# Altium footprint library PCB1.PcbLib: 98 footprints (part 5 of 7)
Each footprint in its own frame and in the unit in brackets; x right, y up, seen from the top. Pads: shape width x height; smd on the part's side, far side on the other; paste and mask are expansions set on the pad; w line width, h text height; cw(c..) or ccw(c..) is an arc to the next point about the centre after c.
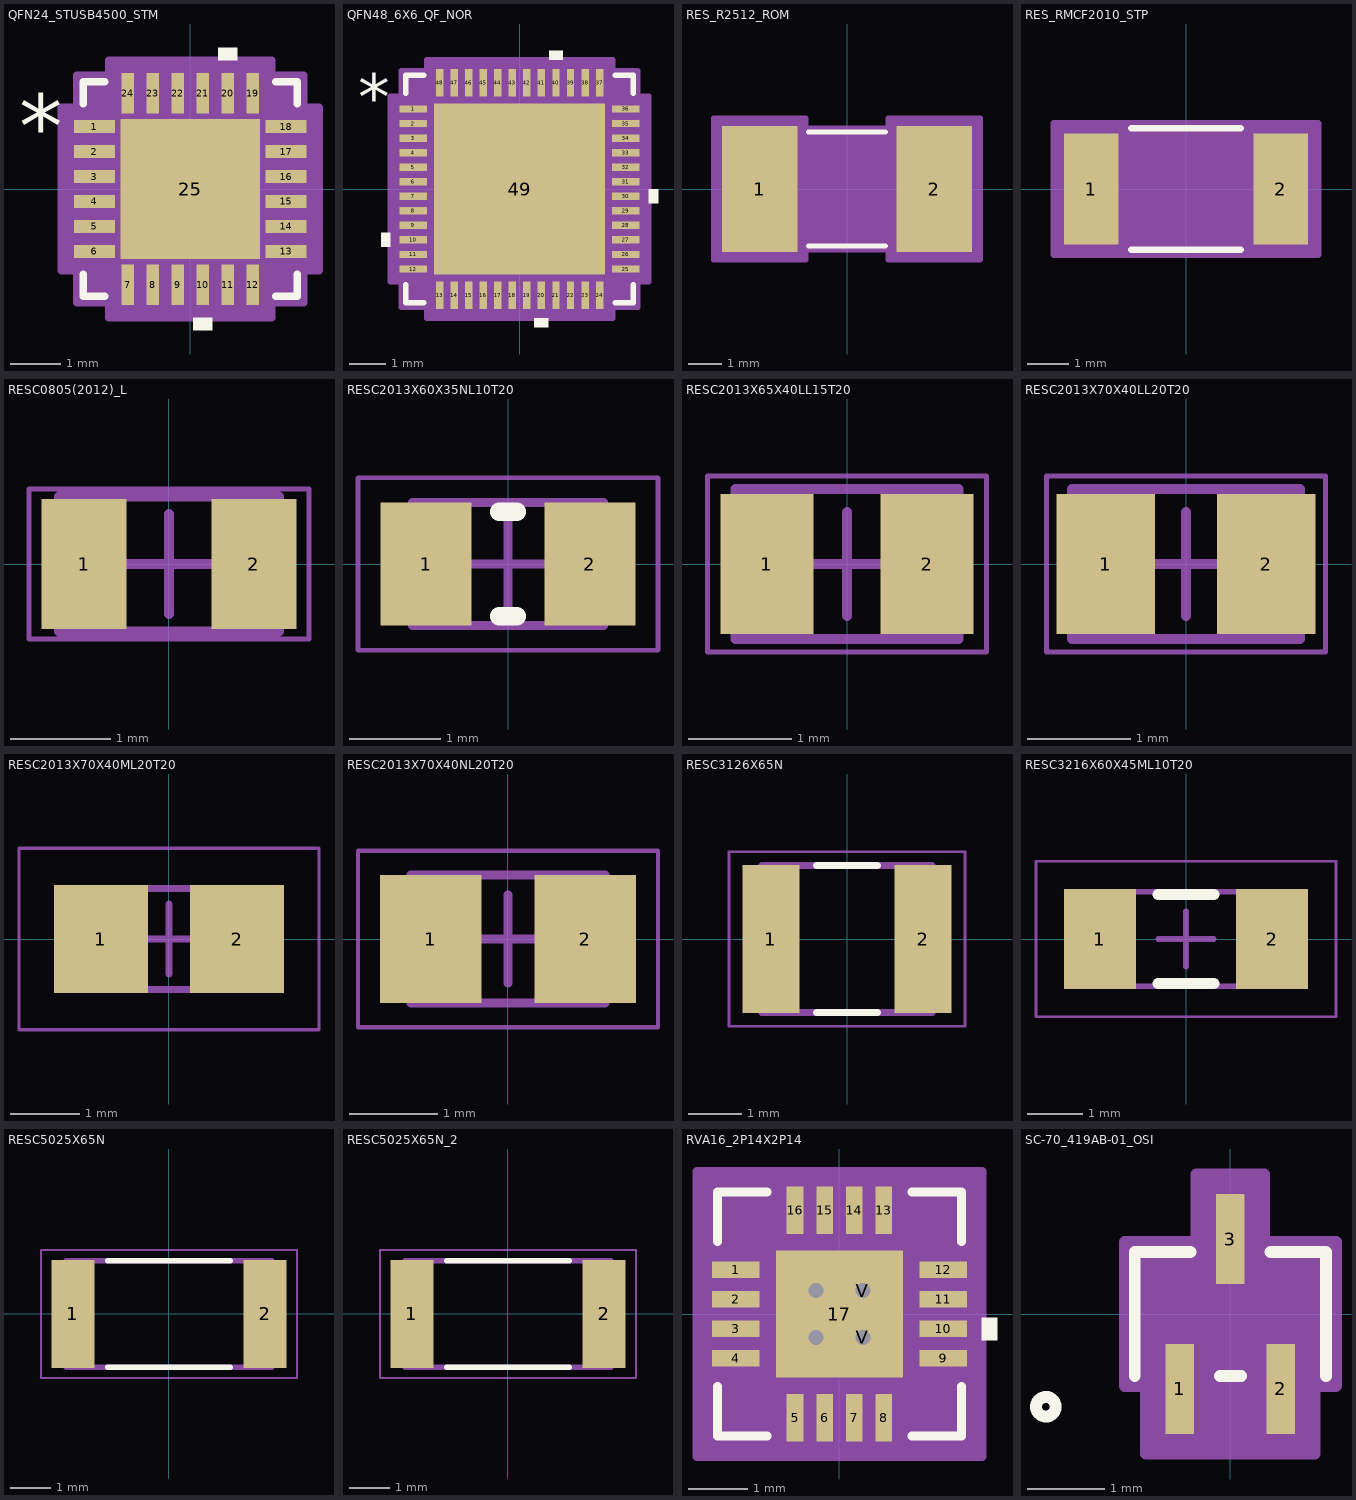
[diagram p4: the footprints below, top view; thin cyan lines are the x and y axes]

## QFN24_STUSB4500_STM [mil]
pads (25):
  rect 32x10 smd paste+0 mask+0: 1(-75.5,49.23) 2(-75.5,29.54) 3(-75.5,9.85) 4(-75.5,-9.85) 5(-75.5,-29.54) 6(-75.5,-49.23) 13(75.5,-49.23) 14(75.5,-29.54) 15(75.5,-9.85) 16(75.5,9.85) 17(75.5,29.54) 18(75.5,49.23)
  rect 10x32 smd paste+0 mask+0: 7(-49.23,-75.5) 8(-29.54,-75.5) 9(-9.85,-75.5) 10(9.85,-75.5) 11(29.54,-75.5) 12(49.23,-75.5) 19(49.23,75.5) 20(29.54,75.5) 21(9.85,75.5) 22(-9.85,75.5) 23(-29.54,75.5) 24(-49.23,75.5)
  rect 110x110 smd paste+0 mask+0: 25(0,0)
Top Overlay:
  region: 37.03,101.5 22.04,101.5 22.04,111.5 37.03,111.5
  region: 17.34,-101.5 2.35,-101.5 2.35,-111.5 17.34,-111.5
  lines w6: -84.5,-67.33 -84.5,-84.5 -67.33,-84.5 ; -84.5,67.33 -84.5,84.5 -67.33,84.5 ; 67.33,-84.5 84.5,-84.5 84.5,-67.33 ; 67.33,84.5 84.5,84.5 84.5,67.33
  text "*" at -135,25 h50
Top 3D Body:
  lines w1: -79.5,29.5 -29.5,79.5 ; -79.5,-79.5 -79.5,79.5 79.5,79.5 79.5,-79.5 -79.5,-79.5 ; -79.5,-55.23 -79.5,-43.23 -79.5,-55.23 ; -79.5,-35.53 -79.5,-23.54 -79.5,-35.53 ; -79.5,-15.85 -79.5,-3.85 -79.5,-15.85 ; -79.5,3.85 -79.5,15.85 -79.5,3.85 ; -79.5,23.54 -79.5,35.53 -79.5,23.54 ; -79.5,43.23 -79.5,55.23 -79.5,43.23 ; -55.23,-79.5 -43.23,-79.5 -55.23,-79.5 ; -55.23,79.5 -43.23,79.5 -55.23,79.5 ; -35.53,-79.5 -23.54,-79.5 -35.53,-79.5 ; -35.53,79.5 -23.54,79.5 -35.53,79.5 ; -15.85,-79.5 -3.85,-79.5 -15.85,-79.5 ; -15.85,79.5 -3.85,79.5 -15.85,79.5 ; 3.85,-79.5 15.85,-79.5 3.85,-79.5 ; 3.85,79.5 15.85,79.5 3.85,79.5 ; 23.54,-79.5 35.53,-79.5 23.54,-79.5 ; 23.54,79.5 35.53,79.5 23.54,79.5 ; 43.23,-79.5 55.23,-79.5 43.23,-79.5 ; 43.23,79.5 55.23,79.5 43.23,79.5 ; 79.5,-55.23 79.5,-43.23 79.5,-55.23 ; 79.5,-35.53 79.5,-23.54 79.5,-35.53 ; 79.5,-15.85 79.5,-3.85 79.5,-15.85 ; 79.5,3.85 79.5,15.85 79.5,3.85 ; 79.5,23.54 79.5,35.53 79.5,23.54 ; 79.5,43.23 79.5,55.23 79.5,43.23
Top Courtyard:
  region: -64.22,-89.5 -89.5,-89.5 -89.5,-64.22 -101.5,-64.22 -101.5,64.22 -89.5,64.22 -89.5,89.5 -64.22,89.5 -64.22,101.5 64.22,101.5 64.22,89.5 89.5,89.5 89.5,64.22 101.5,64.22 101.5,-64.22 89.5,-64.22 89.5,-89.5 64.22,-89.5 64.22,-101.5 -64.22,-101.5
  lines w6: -101.5,-64.22 -101.5,64.22 -89.5,64.22 -89.5,89.5 -64.22,89.5 -64.22,101.5 64.22,101.5 64.22,89.5 89.5,89.5 89.5,64.22 101.5,64.22 101.5,-64.22 89.5,-64.22 89.5,-89.5 64.22,-89.5 64.22,-101.5 -64.22,-101.5 -64.22,-89.5 -89.5,-89.5 -89.5,-64.22 -101.5,-64.22
3D body "QFN24_STUSB4500_STM.step": height 39.09, standoff 0, extent -79.49,-79.49 79.49,79.49

## QFN48_6X6_QF_NOR [mm]
pads (49):
  rect 0.757x0.204 smd paste+0 mask+0: 1(-2.919,2.2) 2(-2.919,1.8) 3(-2.919,1.4) 4(-2.919,1) 5(-2.919,0.6) 6(-2.919,0.2) 7(-2.919,-0.2) 8(-2.919,-0.6) 9(-2.919,-1) 10(-2.919,-1.4) 11(-2.919,-1.8) 12(-2.919,-2.2) 25(2.919,-2.2) 26(2.919,-1.8) 27(2.919,-1.4) 28(2.919,-1) 29(2.919,-0.6) 30(2.919,-0.2) 31(2.919,0.2) 32(2.919,0.6) 33(2.919,1) 34(2.919,1.4) 35(2.919,1.8) 36(2.919,2.2)
  rect 0.204x0.757 smd paste+0 mask+0: 13(-2.2,-2.919) 14(-1.8,-2.919) 15(-1.4,-2.919) 16(-1,-2.919) 17(-0.6,-2.919) 18(-0.2,-2.919) 19(0.2,-2.919) 20(0.6,-2.919) 21(1,-2.919) 22(1.4,-2.919) 23(1.8,-2.919) 24(2.2,-2.919) 37(2.2,2.919) 38(1.8,2.919) 39(1.4,2.919) 40(1,2.919) 41(0.6,2.919) 42(0.2,2.919) 43(-0.2,2.919) 44(-0.6,2.919) 45(-1,2.919) 46(-1.4,2.919) 47(-1.8,2.919) 48(-2.2,2.919)
  rect 4.699x4.699 smd paste-2.349 mask+0: 49(0,0)
Top Overlay:
  region: -3.551,-1.209 -3.805,-1.209 -3.805,-1.59 -3.551,-1.59
  region: 0.79,-3.551 0.409,-3.551 0.409,-3.805 0.79,-3.805
  region: 3.551,-0.009 3.805,-0.009 3.805,-0.39 3.551,-0.39
  region: 1.191,3.551 0.81,3.551 0.81,3.805 1.191,3.805
  lines w0.152: -3.124,-2.635 -3.124,-3.124 -2.635,-3.124 ; -3.124,2.635 -3.124,3.124 -2.635,3.124 ; 2.635,-3.124 3.124,-3.124 3.124,-2.635 ; 2.635,3.124 3.124,3.124 3.124,2.635
  text "*" at -4.443,1.889 h1.27
Top Paste:
  region: -0.883,2.25 -2.25,2.25 -2.25,0.883 -0.883,0.883
  region: -0.883,0.683 -2.25,0.683 -2.25,-0.683 -0.883,-0.683
  region: -0.883,-0.883 -2.25,-0.883 -2.25,-2.25 -0.883,-2.25
  region: 0.683,2.25 -0.683,2.25 -0.683,0.883 0.683,0.883
  region: 0.683,0.683 -0.683,0.683 -0.683,-0.683 0.683,-0.683
  region: 0.683,-0.883 -0.683,-0.883 -0.683,-2.25 0.683,-2.25
  region: 2.25,2.25 0.883,2.25 0.883,0.883 2.25,0.883
  region: 2.25,0.683 0.883,0.683 0.883,-0.683 2.25,-0.683
  region: 2.25,-0.883 0.883,-0.883 0.883,-2.25 2.25,-2.25
Top 3D Body:
  lines w0.025: -2.997,1.727 -1.727,2.997 ; -2.997,-2.997 2.997,-2.997 2.997,2.997 -2.997,2.997 -2.997,-2.997 ; -2.997,-2.327 -2.997,-2.073 -2.997,-2.327 ; -2.997,-1.927 -2.997,-1.673 -2.997,-1.927 ; -2.997,-1.527 -2.997,-1.273 -2.997,-1.527 ; -2.997,-1.127 -2.997,-0.873 -2.997,-1.127 ; -2.997,-0.727 -2.997,-0.473 -2.997,-0.727 ; -2.997,-0.327 -2.997,-0.073 -2.997,-0.327 ; -2.997,0.073 -2.997,0.327 -2.997,0.073 ; -2.997,0.473 -2.997,0.727 -2.997,0.473 ; -2.997,0.873 -2.997,1.127 -2.997,0.873 ; -2.997,1.273 -2.997,1.527 -2.997,1.273 ; -2.997,1.673 -2.997,1.927 -2.997,1.673 ; -2.997,2.073 -2.997,2.327 -2.997,2.073 ; -2.327,-2.997 -2.073,-2.997 -2.327,-2.997 ; -2.327,2.997 -2.073,2.997 -2.327,2.997 ; -1.927,-2.997 -1.673,-2.997 -1.927,-2.997 ; -1.927,2.997 -1.673,2.997 -1.927,2.997 ; -1.527,-2.997 -1.273,-2.997 -1.527,-2.997 ; -1.527,2.997 -1.273,2.997 -1.527,2.997 ; -1.127,-2.997 -0.873,-2.997 -1.127,-2.997 ; -1.127,2.997 -0.873,2.997 -1.127,2.997 ; -0.727,-2.997 -0.473,-2.997 -0.727,-2.997 ; -0.727,2.997 -0.473,2.997 -0.727,2.997 ; -0.327,-2.997 -0.073,-2.997 -0.327,-2.997 ; -0.327,2.997 -0.073,2.997 -0.327,2.997 ; 0.073,-2.997 0.327,-2.997 0.073,-2.997 ; 0.073,2.997 0.327,2.997 0.073,2.997 ; 0.473,-2.997 0.727,-2.997 0.473,-2.997 ; 0.473,2.997 0.727,2.997 0.473,2.997 ; 0.873,-2.997 1.127,-2.997 0.873,-2.997 ; 0.873,2.997 1.127,2.997 0.873,2.997 ; 1.273,-2.997 1.527,-2.997 1.273,-2.997 ; 1.273,2.997 1.527,2.997 1.273,2.997 ; 1.673,-2.997 1.927,-2.997 1.673,-2.997 ; 1.673,2.997 1.927,2.997 1.673,2.997 ; 2.073,-2.997 2.327,-2.997 2.073,-2.997 ; 2.073,2.997 2.327,2.997 2.073,2.997 ; 2.997,-2.327 2.997,-2.073 2.997,-2.327 ; 2.997,-1.927 2.997,-1.673 2.997,-1.927 ; 2.997,-1.527 2.997,-1.273 2.997,-1.527 ; 2.997,-1.127 2.997,-0.873 2.997,-1.127 ; 2.997,-0.727 2.997,-0.473 2.997,-0.727 ; 2.997,-0.327 2.997,-0.073 2.997,-0.327 ; 2.997,0.073 2.997,0.327 2.997,0.073 ; 2.997,0.473 2.997,0.727 2.997,0.473 ; 2.997,0.873 2.997,1.127 2.997,0.873 ; 2.997,1.273 2.997,1.527 2.997,1.273 ; 2.997,1.673 2.997,1.927 2.997,1.673 ; 2.997,2.073 2.997,2.327 2.997,2.073
Top Courtyard:
  region: -2.556,-3.251 -3.251,-3.251 -3.251,-2.556 -3.551,-2.556 -3.551,2.556 -3.251,2.556 -3.251,3.251 -2.556,3.251 -2.556,3.551 2.556,3.551 2.556,3.251 3.251,3.251 3.251,2.556 3.551,2.556 3.551,-2.556 3.251,-2.556 3.251,-3.251 2.556,-3.251 2.556,-3.551 -2.556,-3.551
  lines w0.152: -3.551,-2.556 -3.251,-2.556 -3.251,-3.251 -2.556,-3.251 -2.556,-3.551 2.556,-3.551 2.556,-3.251 3.251,-3.251 3.251,-2.556 3.551,-2.556 3.551,2.556 3.251,2.556 3.251,3.251 2.556,3.251 2.556,3.551 -2.556,3.551 -2.556,3.251 -3.251,3.251 -3.251,2.556 -3.551,2.556 -3.551,-2.556
3D body "QFN48_6X6_QF_NOR.step": height 0.89, standoff 0, extent -2.997,-2.997 2.997,2.997

## RES_R2512_ROM [mil]
pads (2):
  rect 90.5x150 smd paste+0 mask+0: 1(-104.25,0) 2(104.25,0)
Top Overlay:
  lines w6: -45.9,-68 45.9,-68 ; -45.9,68 45.9,68
Top 3D Body:
  lines w1: -126,-63 -126,63 126,63 126,-63 -126,-63
Top Courtyard:
  region: -49,73 49,73 49,-85 159.5,-85 159.5,85 49,85 49,-85 49,-73 -49,-73 -49,85 -159.5,85 -159.5,-85 -49,-85 -49,85
  lines w6: -49,85 -49,73 49,73 49,-85 ; -49,85 -49,-85 -159.5,-85 -159.5,85 -49,85 ; -49,85 -49,-73 49,-73 49,-85 ; 49,-85 49,85 159.5,85 159.5,-85 49,-85
3D body "Resistor_2512.step": height 25.98, standoff 0.39, extent -117.53,-60.88 130.5,65.1

## RES_RMCF2010_STP [mil]
pads (2):
  rect 52x106 smd paste+0 mask+0: 1(-90.5,0) 2(90.5,0)
Top Overlay:
  lines w6: -52.39,-58 52.39,-58 ; -52.39,58 52.39,58
Top 3D Body:
  lines w1: -102.5,-53 -102.5,53 ; -102.5,-53 -64.5,-53 -64.5,53 -102.5,53 ; -102.5,-53 102.5,-53 ; -102.5,-53 -102.5,53 ; -102.5,53 102.5,53 ; 102.5,-53 64.5,-53 64.5,53 102.5,53 ; 102.5,-53 102.5,53 ; 102.5,-53 102.5,53
Top Courtyard:
  region: 126.5,-63 -126.5,-63 -126.5,63 126.5,63
  lines w6: -126.5,-63 -126.5,63 126.5,63 126.5,-63 -126.5,-63
3D body "RES_RMCF2010_STP.step": height 27.99, standoff 0, extent -102.52,-52.99 102.52,52.99

## RESC0805(2012)_L [mm]
pads (2):
  rect 0.85x1.3 smd: 1(-0.85,0) 2(0.85,0)
Top 3D Body:
  lines w0.1: -1.1,-0.675 1.1,-0.675 1.1,0.675 -1.1,0.675 -1.1,-0.675
Top Courtyard:
  lines w0.05: -1.4,-0.75 1.4,-0.75 1.4,0.75 -1.4,0.75 -1.4,-0.75
  lines w0.1: -0.5,0 0.5,0 ; 0,-0.5 0,0.5
3D body: height 0.7, standoff 0, extent 0.68,-0.675 1.1,0.675
3D body: height 0.7, standoff 0, extent -0.68,-0.675 0.68,0.675
3D body: height 0.7, standoff 0, extent -1.1,-0.675 -0.68,0.675

## RESC2013X60X35NL10T20 [mm]
pads (2):
  rect 1x1.35 smd: 1(-0.9,0) 2(0.9,0)
Top Overlay:
  lines w0.2: -0.1,-0.575 0.1,-0.575 ; -0.1,0.575 0.1,0.575
Top 3D Body:
  lines w0.1: -1.05,-0.675 1.05,-0.675 1.05,0.675 -1.05,0.675 -1.05,-0.675
Top Courtyard:
  lines w0.05: -1.65,-0.95 1.65,-0.95 1.65,0.95 -1.65,0.95 -1.65,-0.95
  lines w0.1: -0.5,0 0.5,0 ; 0,-0.5 0,0.5
3D body: height 0.6, standoff 0, extent 0.7,-0.675 1.05,0.675
3D body: height 0.6, standoff 0, extent -1.05,-0.675 -0.7,0.675
3D body: height 0.6, standoff 0, extent -0.7,-0.675 0.7,0.675

## RESC2013X65X40LL15T20 [mm]
pads (2):
  rect 0.9x1.35 smd: 1(-0.775,0) 2(0.775,0)
Top 3D Body:
  lines w0.1: -1.075,-0.725 1.075,-0.725 1.075,0.725 -1.075,0.725 -1.075,-0.725
Top Courtyard:
  lines w0.05: -1.35,-0.85 1.35,-0.85 1.35,0.85 -1.35,0.85 -1.35,-0.85
  lines w0.1: -0.5,0 0.5,0 ; 0,-0.5 0,0.5
3D body: height 0.65, standoff 0, extent 0.675,-0.725 1.075,0.725
3D body: height 0.65, standoff 0, extent -1.075,-0.725 -0.675,0.725
3D body: height 0.65, standoff 0, extent -0.675,-0.725 0.675,0.725

## RESC2013X70X40LL20T20 [mm]
pads (2):
  rect 0.95x1.35 smd: 1(-0.775,0) 2(0.775,0)
Top 3D Body:
  lines w0.1: -1.1,-0.725 1.1,-0.725 1.1,0.725 -1.1,0.725 -1.1,-0.725
Top Courtyard:
  lines w0.05: -1.35,-0.85 1.35,-0.85 1.35,0.85 -1.35,0.85 -1.35,-0.85
  lines w0.1: -0.5,0 0.5,0 ; 0,-0.5 0,0.5
3D body: height 0.7, standoff 0, extent 0.7,-0.725 1.1,0.725
3D body: height 0.7, standoff 0, extent -1.1,-0.725 -0.7,0.725
3D body: height 0.7, standoff 0, extent -0.7,-0.725 0.7,0.725

## RESC2013X70X40ML20T20 [mm]
pads (2):
  rect 1.35x1.55 smd: 1(-0.975,0) 2(0.975,0)
Top 3D Body:
  lines w0.1: -1.1,-0.725 -1.1,0.725 1.1,0.725 1.1,-0.725 -1.1,-0.725
Top Courtyard:
  lines w0.05: -2.15,-1.3 -2.15,1.3 2.15,1.3 2.15,-1.3 -2.15,-1.3
  lines w0.1: -0.5,0 0.5,0 ; 0,-0.5 0,0.5
3D body: height 0.7, standoff 0, extent -0.7,-0.725 0.7,0.725
3D body: height 0.7, standoff 0, extent -1.1,-0.725 -0.7,0.725
3D body: height 0.7, standoff 0, extent 0.7,-0.725 1.1,0.725

## RESC2013X70X40NL20T20 [mm]
pads (2):
  rect 1.15x1.45 smd: 1(-0.875,0) 2(0.875,0)
Top 3D Body:
  lines w0.1: -1.1,-0.725 -1.1,0.725 1.1,0.725 1.1,-0.725 -1.1,-0.725
Top Courtyard:
  lines w0.05: -1.7,-1 -1.7,1 1.7,1 1.7,-1 -1.7,-1
  lines w0.1: -0.5,0 0.5,0 ; 0,-0.5 0,0.5
3D body: height 0.7, standoff 0, extent -0.7,-0.725 0.7,0.725
3D body: height 0.7, standoff 0, extent -1.1,-0.725 -0.7,0.725
3D body: height 0.7, standoff 0, extent 0.7,-0.725 1.1,0.725

## RESC3126X65N [mm]
pads (2):
  rect 1.07x2.77 smd: 1(-1.43,0) 2(1.43,0)
Top Overlay:
  lines w0.127: -0.57,-1.38 0.57,-1.38 ; -0.57,1.38 0.57,1.38
Top 3D Body:
  lines w0.127: -1.6,-1.38 1.6,-1.38 1.6,1.38 -1.6,1.38 -1.6,-1.38
Top Courtyard:
  lines w0.05: -2.215,-1.635 2.215,-1.635 2.215,1.635 -2.215,1.635 -2.215,-1.635
3D body "step_temp.STEP": height 0.65, standoff 0, extent -1.55,-1.3 1.55,1.3

## RESC3216X60X45ML10T20 [mm]
pads (2):
  rect 1.3x1.8 smd: 1(-1.55,0) 2(1.55,0)
Top Overlay:
  lines w0.2: -0.5,-0.8 0.5,-0.8 ; -0.5,0.8 0.5,0.8
Top 3D Body:
  lines w0.1: -1.65,-0.85 1.65,-0.85 1.65,0.85 -1.65,0.85 -1.65,-0.85
Top Courtyard:
  lines w0.05: -2.7,-1.4 2.7,-1.4 2.7,1.4 -2.7,1.4 -2.7,-1.4
  lines w0.1: -0.5,0 0.5,0 ; 0,-0.5 0,0.5
3D body: height 0.6, standoff 0, extent 1.2,-0.85 1.65,0.85
3D body: height 0.6, standoff 0, extent -1.65,-0.85 -1.2,0.85
3D body: height 0.6, standoff 0, extent -1.2,-0.85 1.2,0.85

## RESC5025X65N [mm]
pads (2):
  rect 1.07x2.67 smd: 1(-2.38,0) 2(2.38,0)
Top Overlay:
  lines w0.127: -1.52,-1.32 1.52,-1.32 ; -1.52,1.32 1.52,1.32
Top 3D Body:
  lines w0.127: -2.55,-1.32 -2.55,1.32 2.55,1.32 2.55,-1.32 -2.55,-1.32
Top Courtyard:
  lines w0.05: -3.165,-1.585 -3.165,1.585 3.165,1.585 3.165,-1.585 -3.165,-1.585
3D body "RC2010JK-079K1L.step": height 0.65, standoff 0, extent -2.373,-1.25 2.627,1.25

## RESC5025X65N_2 [mm]
pads (2):
  rect 1.07x2.67 smd: 1(-2.38,0) 2(2.38,0)
Top Overlay:
  lines w0.127: -1.52,-1.32 1.52,-1.32 ; -1.52,1.32 1.52,1.32
Top 3D Body:
  lines w0.127: -2.55,-1.32 -2.55,1.32 2.55,1.32 2.55,-1.32 -2.55,-1.32
Top Courtyard:
  lines w0.05: -3.165,-1.585 -3.165,1.585 3.165,1.585 3.165,-1.585 -3.165,-1.585
3D body "RC2010JK-079K1L.step": height 0.65, standoff 0, extent -2.373,-1.25 2.627,1.25

## RVA16_2P14X2P14 [mm]
pads (21):
  rect 0.8x0.28 smd paste-0.14 mask-0.394: 1(-1.75,0.75) 2(-1.75,0.25) 3(-1.75,-0.25) 4(-1.75,-0.75) 9(1.75,-0.75) 10(1.75,-0.25) 11(1.75,0.25) 12(1.75,0.75)
  rect 0.28x0.8 smd paste-0.14 mask-0.394: 5(-0.75,-1.75) 6(-0.25,-1.75) 7(0.25,-1.75) 8(0.75,-1.75) 13(0.75,1.75) 14(0.25,1.75) 15(-0.25,1.75) 16(-0.75,1.75)
  rect 2.14x2.14 smd paste-1.057 mask-1.054: 17(0,0)
  round 0.508 hole 0.254 paste-2539.97 mask-0.254: V(0.394,-0.394) V(0.394,0.394) ""(-0.394,-0.394) ""(-0.394,0.394)
Top Overlay:
  region: 2.404,-0.059 2.658,-0.059 2.658,-0.44 2.404,-0.44
  lines w0.152: -2.057,-1.223 -2.057,-2.057 -1.223,-2.057 ; -2.057,1.223 -2.057,2.057 -1.223,2.057 ; 1.223,-2.057 2.057,-2.057 2.057,-1.223 ; 1.223,2.057 2.057,2.057 2.057,1.223
Top Paste:
  region: 0.995,-0.494 0.635,-0.494 0.494,-0.635 0.494,-0.995 0.995,-0.995
  region: 0.995,0.294 0.635,0.294 0.494,0.152 0.494,-0.152 0.635,-0.294 0.995,-0.294
  region: 0.995,0.995 0.494,0.995 0.494,0.635 0.635,0.494 0.995,0.494
  region: 0.152,-0.494 -0.152,-0.494 -0.294,-0.635 -0.294,-0.995 0.294,-0.995 0.294,-0.635
  region: 0.152,0.294 -0.152,0.294 -0.294,0.152 -0.294,-0.152 -0.152,-0.294 0.152,-0.294 0.294,-0.152 0.294,0.152
  region: 0.294,0.995 -0.294,0.995 -0.294,0.635 -0.152,0.494 0.152,0.494 0.294,0.635
  region: -0.635,-0.494 -0.995,-0.494 -0.995,-0.995 -0.494,-0.995 -0.494,-0.635
  region: -0.635,0.294 -0.995,0.294 -0.995,-0.294 -0.635,-0.294 -0.494,-0.152 -0.494,0.152
  region: -0.494,0.995 -0.995,0.995 -0.995,0.494 -0.635,0.494 -0.494,0.635
  region: -0.635,2.125 -0.865,2.125 -0.865,1.375 -0.635,1.375
  region: -0.135,2.125 -0.365,2.125 -0.365,1.375 -0.135,1.375
  region: 0.365,2.125 0.135,2.125 0.135,1.375 0.365,1.375
  region: 0.865,2.125 0.635,2.125 0.635,1.375 0.865,1.375
  region: 2.125,0.865 1.375,0.865 1.375,0.635 2.125,0.635
  region: 2.125,0.365 1.375,0.365 1.375,0.135 2.125,0.135
  region: 2.125,-0.135 1.375,-0.135 1.375,-0.365 2.125,-0.365
  region: 2.125,-0.635 1.375,-0.635 1.375,-0.865 2.125,-0.865
  region: 0.865,-1.375 0.635,-1.375 0.635,-2.125 0.865,-2.125
  region: 0.365,-1.375 0.135,-1.375 0.135,-2.125 0.365,-2.125
  region: -0.135,-1.375 -0.365,-1.375 -0.365,-2.125 -0.135,-2.125
  region: -0.635,-1.375 -0.865,-1.375 -0.865,-2.125 -0.635,-2.125
  region: -1.375,-0.635 -2.125,-0.635 -2.125,-0.865 -1.375,-0.865
  region: -1.375,-0.135 -2.125,-0.135 -2.125,-0.365 -1.375,-0.365
  region: -1.375,0.365 -2.125,0.365 -2.125,0.135 -1.375,0.135
  region: -1.375,0.865 -2.125,0.865 -2.125,0.635 -1.375,0.635
Top Solder:
  region: 0.594,-1.134 0.594,1.134 1.134,1.134 1.134,-1.134
  region: 0.194,-1.134 0.194,1.134 -0.194,1.134 -0.194,-1.134
  region: -1.134,-1.134 -1.134,1.134 -0.594,1.134 -0.594,-1.134
  region: -1.134,-1.134 -1.134,-0.594 1.134,-0.594 1.134,-1.134
  region: -1.134,-0.194 -1.134,0.194 1.134,0.194 1.134,-0.194
  region: -1.134,0.594 -1.134,1.134 1.134,1.134 1.134,0.594
  region: -0.54,2.22 -0.96,2.22 -0.96,1.28 -0.54,1.28
  region: -0.04,2.22 -0.46,2.22 -0.46,1.28 -0.04,1.28
  region: 0.46,2.22 0.04,2.22 0.04,1.28 0.46,1.28
  region: 0.96,2.22 0.54,2.22 0.54,1.28 0.96,1.28
  region: 2.22,0.96 1.28,0.96 1.28,0.54 2.22,0.54
  region: 2.22,0.46 1.28,0.46 1.28,0.04 2.22,0.04
  region: 2.22,-0.04 1.28,-0.04 1.28,-0.46 2.22,-0.46
  region: 2.22,-0.54 1.28,-0.54 1.28,-0.96 2.22,-0.96
  region: 0.96,-1.28 0.54,-1.28 0.54,-2.22 0.96,-2.22
  region: 0.46,-1.28 0.04,-1.28 0.04,-2.22 0.46,-2.22
  region: -0.04,-1.28 -0.46,-1.28 -0.46,-2.22 -0.04,-2.22
  region: -0.54,-1.28 -0.96,-1.28 -0.96,-2.22 -0.54,-2.22
  region: -1.28,-0.54 -2.22,-0.54 -2.22,-0.96 -1.28,-0.96
  region: -1.28,-0.04 -2.22,-0.04 -2.22,-0.46 -1.28,-0.46
  region: -1.28,0.46 -2.22,0.46 -2.22,0.04 -1.28,0.04
  region: -1.28,0.96 -2.22,0.96 -2.22,0.54 -1.28,0.54
Top 3D Body:
  lines w0.025: -1.803,0.533 -0.533,1.803 ; -1.803,-1.803 -1.803,1.803 1.803,1.803 1.803,-1.803 -1.803,-1.803 ; -1.803,-0.902 -1.803,-0.598 -1.803,-0.902 ; -1.803,-0.402 -1.803,-0.098 -1.803,-0.402 ; -1.803,0.098 -1.803,0.402 -1.803,0.098 ; -1.803,0.598 -1.803,0.902 -1.803,0.598 ; -0.902,-1.803 -0.598,-1.803 -0.902,-1.803 ; -0.902,1.803 -0.598,1.803 -0.902,1.803 ; -0.402,-1.803 -0.098,-1.803 -0.402,-1.803 ; -0.402,1.803 -0.098,1.803 -0.402,1.803 ; 0.098,-1.803 0.402,-1.803 0.098,-1.803 ; 0.098,1.803 0.402,1.803 0.098,1.803 ; 0.598,-1.803 0.902,-1.803 0.598,-1.803 ; 0.598,1.803 0.902,1.803 0.598,1.803 ; 1.803,-0.902 1.803,-0.598 1.803,-0.902 ; 1.803,-0.402 1.803,-0.098 1.803,-0.402 ; 1.803,0.098 1.803,0.402 1.803,0.098 ; 1.803,0.598 1.803,0.902 1.803,0.598
Top Courtyard:
  region: 2.404,-2.404 -2.404,-2.404 -2.404,2.404 2.404,2.404
  lines w0.152: -2.404,-2.404 2.404,-2.404 2.404,2.404 -2.404,2.404 -2.404,-2.404
3D body "RVA16_2P14X2P14.step": height 1.4, standoff 0, extent -1.854,-1.854 1.854,1.854

## SC-70_419AB-01_OSI [mil]
pads (3):
  rect 14.36x45.56 smd paste+0 mask+0: 1(-25.59,-38) 2(25.59,-38) 3(0,38)
Top Overlay:
  circle w6: c-93.5,-47 r5
  lines w6: -48.5,-31.5 -48.5,31.5 -20.28,31.5 ; -5.31,-31.5 5.31,-31.5 ; 20.28,31.5 48.5,31.5 48.5,-31.5
Top 3D Body:
  circle w1: c-33.5,-16.5 r5
  lines w1: -43.5,-26.5 -43.5,26.5 43.5,26.5 43.5,-26.5 -43.5,-26.5 ; -31.59,-47 -19.59,-47 -19.59,-26.5 -31.59,-26.5 -31.59,-47 ; -6,26.5 -6,47 6,47 6,26.5 -6,26.5 ; 19.59,-47 31.59,-47 31.59,-26.5 19.59,-26.5 19.59,-47
Top Courtyard:
  region: 43.5,-26.5 -43.5,-26.5 -43.5,26.5 43.5,26.5
  region: -53.5,-36.5 -53.5,36.5 -17.18,36.5 -17.18,70.78 17.18,70.78 17.18,36.5 53.5,36.5 53.5,-36.5 42.77,-36.5 42.77,-70.78 -42.77,-70.78 -42.77,-36.5
  lines w6: -53.5,-36.5 -42.77,-36.5 -42.77,-70.78 42.77,-70.78 42.77,-36.5 53.5,-36.5 53.5,36.5 17.18,36.5 17.18,70.78 -17.18,70.78 -17.18,36.5 -53.5,36.5 -53.5,-36.5
3D body "SC-70_419AB-01_OSI.step": height 43.11, standoff 0, extent -43.5,-47.01 43.5,47.01